# Altium footprint library PcbLibLafe.PcbLib: 297 footprints (part 14 of 19)
Each footprint in its own frame and in the unit in brackets; x right, y up, seen from the top. Pads: shape width x height; smd on the part's side, far side on the other; paste and mask are expansions set on the pad; w line width, h text height; cw(c..) or ccw(c..) is an arc to the next point about the centre after c.
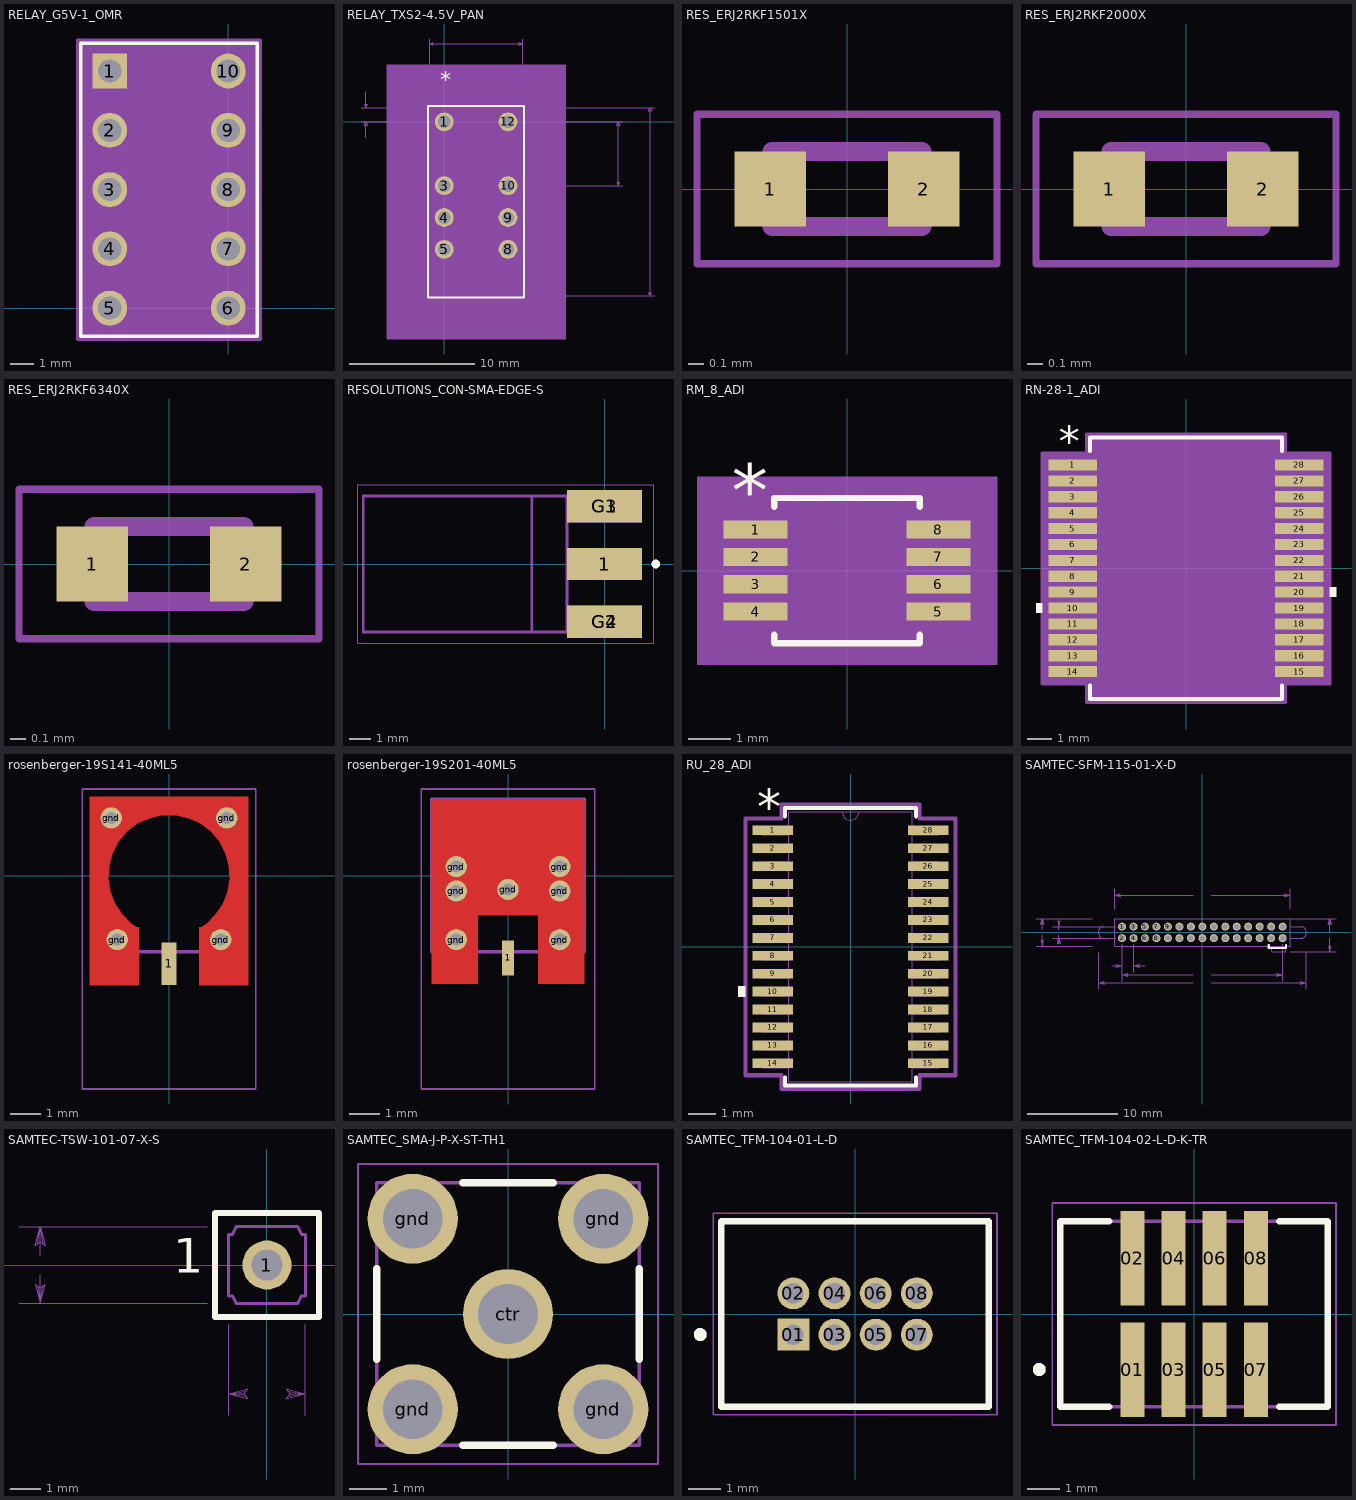
[diagram p13: the footprints below, top view; thin cyan lines are the x and y axes]

## RELAY_G5V-1_OMR [mil]
pads (10):
  rect 59x59 / inner round 59 / far side round 59 hole 39 mask+0: 1(-200,400)
  round 59 hole 39 mask+0: 2(-200,300) 3(-200,200) 4(-200,100) 5(-200,0) 6(0,0) 7(0,100) 8(0,200) 9(0,300) 10(0,400)
Top Overlay:
  lines w6: -248.7,-47.13 -248.7,447.13 48.7,447.13 48.7,-47.13 -248.7,-47.13
Mechanical 13:
  lines w0: -112,442.13 ccw(c-100,442.13) -88,442.13
  lines w1: -243.7,-42.13 -243.7,442.13 43.7,442.13 43.7,-42.13 -243.7,-42.13
Mechanical 15:
  region: 43.7,-42.13 -243.7,-42.13 -243.7,442.13 43.7,442.13
  region: 53.7,-52.13 -253.7,-52.13 -253.7,452.13 53.7,452.13
  lines w6: -253.7,-52.13 53.7,-52.13 53.7,452.13 -253.7,452.13 -253.7,-52.13
3D body "G5V_1.step": height 393.7, standoff -137.8, extent -250,-46.06 45.28,446.06
3D body: height 10, standoff 0, extent 0,0 10,10

## RELAY_TXS2-4.5V_PAN [mil]
pads (8):
  round 59 hole 39 mask+0: 1(0,0) 3(0,-200) 4(0,-300) 5(0,-400) 8(200,-400) 9(200,-300) 10(200,-200) 12(200,0)
Top Overlay:
  lines w6: -50.5,-551 -50.5,50 250.5,50 250.5,-551 -50.5,-551
  text "*" at -12.5,106.67 h50
Mechanical 5:
  region: 380.5,-681 -180.5,-681 -180.5,180 380.5,180
Mechanical 7:
  lines w1: -260.5,0 245.5,0 ; -260.5,45 100,45 660.5,45 ; -245.5,-50 -245.5,0 ; -245.5,95 -245.5,45 ; -45.5,-250.5 -45.5,260 ; 0,-250.5 0,160 ; 100,0 560.5,0 ; 200,-250.5 200,160 ; 245.5,-546 660.5,-546 ; 245.5,-250.5 245.5,260 ; 245.5,-200 560.5,-200 ; -245.5,0 -240.5,-10 -250.5,-10 -245.5,0 ; -245.5,45 -240.5,55 -250.5,55 -245.5,45 ; -45.5,245 -35.5,240 -35.5,250 -45.5,245 ; -45.5,245 245.5,245 ; 0,145 10,140 10,150 0,145 ; 0,145 200,145 ; 200,145 190,140 190,150 200,145 ; 245.5,245 235.5,240 235.5,250 245.5,245 ; 545.5,-200 550.5,-190 540.5,-190 545.5,-200 ; 545.5,-200 545.5,0 ; 545.5,0 550.5,-10 540.5,-10 545.5,0 ; 645.5,-546 650.5,-536 640.5,-536 645.5,-546 ; 645.5,-546 645.5,45 ; 645.5,45 650.5,35 640.5,35 645.5,45
  text "0.591in/15.011mm" at 665.5,-263 h25
  text "0.2in/5.08mm" at 565.5,-112.5 h25
  text "0.045in/1.143mm" at -453,10 h25
  text "0.2in/5.08mm" at 25,165 h25
  text "0.291in/7.391mm" at 6.25,265 h25
  text "Alt 2 Padstyle: OX90Y60D30P" at -237.5,-866 h50
  text "Alt 1 Padstyle: OX60Y90D30P" at -237.5,-806 h50
  text "Default Padstyle: EX59Y59D39P" at -262.5,-746 h50
Mechanical 13:
  lines w0: 88,45 ccw(c100,45) 112,45
  lines w1: -45.5,-546 -45.5,45 245.5,45 245.5,-546 -45.5,-546
  text "*" at -12.5,16.67 h50
Mechanical 15:
  region: 245.5,-546 -45.5,-546 -45.5,45 245.5,45
  region: 255.5,-556 -55.5,-556 -55.5,55 255.5,55
  lines w6: -55.5,-556 255.5,-556 255.5,55 -55.5,55 -55.5,-556
3D body "RELAY_08_7P4X15_PAN.step": height 323.11, standoff -100, extent -45.5,-545.98 245.52,45
3D body: height 10, standoff 0, extent 0,0 10,10

## RES_ERJ2RKF1501X [mm]
pads (2):
  rect 0.475x0.5 smd: 1(-0.512,0) 2(0.512,0)
Mechanical 13:
  lines w0.127: -0.5,-0.25 -0.5,0.25 0.5,0.25 0.5,-0.25 -0.5,-0.25
Mechanical 15:
  lines w0.05: -1,-0.5 -1,0.5 1,0.5 1,-0.5 -1,-0.5
3D body "step_temp.STEP": height 0.35, standoff 0, extent -0.5,-0.25 0.5,0.25

## RES_ERJ2RKF2000X [mm]
pads (2):
  rect 0.475x0.5 smd: 1(-0.512,0) 2(0.512,0)
Mechanical 13:
  lines w0.127: -0.5,-0.25 -0.5,0.25 0.5,0.25 0.5,-0.25 -0.5,-0.25
Mechanical 15:
  lines w0.05: -1,-0.5 -1,0.5 1,0.5 1,-0.5 -1,-0.5
3D body "step_temp.STEP": height 0.35, standoff 0, extent -0.5,-0.25 0.5,0.25

## RES_ERJ2RKF6340X [mm]
pads (2):
  rect 0.475x0.5 smd: 1(-0.512,0) 2(0.512,0)
Mechanical 13:
  lines w0.127: -0.5,-0.25 -0.5,0.25 0.5,0.25 0.5,-0.25 -0.5,-0.25
Mechanical 15:
  lines w0.05: -1,-0.5 -1,0.5 1,0.5 1,-0.5 -1,-0.5
3D body "step_temp.STEP": height 0.35, standoff 0, extent -0.5,-0.25 0.5,0.25

## RFSOLUTIONS_CON-SMA-EDGE-S [mm]
height 6.35
pads (5):
  rect 3.5x1.5 smd: 1(0,0) G1(0,2.7) G2(0,-2.7)
  rect 3.5x1.5 smd far side: G3(0,2.7) G4(0,-2.7)
Top Overlay:
  circle w0.2: c2.4,0 r0.1
Mechanical 13:
  circle w0.2: c2.4,0 r0.1
  lines w0.127: -3.4,-3.175 -1.75,-3.175 -1.75,3.175 -3.4,3.175 ; -3.4,-3.175 -3.4,3.175 ; -3.4,-3.175 -11.27,-3.175 -11.27,3.175 -3.4,3.175
Top Component Center:
  lines w0.127: -3.4,-3.175 -3.4,3.175 ; -3.4,-3.175 -1.75,-3.175 -1.75,3.175 -3.4,3.175 ; -3.4,-3.175 -11.27,-3.175 -11.27,3.175 -3.4,3.175
Mechanical 15:
  lines w0.05: -11.52,-3.7 2.31,-3.7 2.31,3.7 -11.52,3.7 -11.52,-3.7
Mechanical 16:
  lines w0.05: -11.52,-3.7 2.31,-3.7 2.31,3.7 -11.52,3.7 -11.52,-3.7
3D body "step_temp.STEP": height 3.55, standoff -2.8, extent -11.27,-3.175 2.06,3.175

## RM_8_ADI [mil]
pads (8):
  rect 60x17 smd paste+0 mask+0: 1(-85.5,38.39) 2(-85.5,12.8) 3(-85.5,-12.8) 4(-85.5,-38.39) 5(85.5,-38.39) 6(85.5,-12.8) 7(85.5,12.8) 8(85.5,38.39)
Top Overlay:
  lines w6: -68,-59.99 -68,-68 68,-68 68,-59.99 ; -68,59.99 -68,68 68,68 68,59.99
  text "*" at -108,50.39 h50
Mechanical 5:
  region: 140.5,-88 -140.5,-88 -140.5,88 140.5,88
Mechanical 13:
  lines w0: -12,63 ccw(c0,63) 12,63
  lines w1: -101.5,-45.89 -63,-45.89 -63,-30.89 -101.5,-30.89 -101.5,-45.89 ; -101.5,-20.3 -63,-20.3 -63,-5.3 -101.5,-5.3 -101.5,-20.3 ; -101.5,5.3 -63,5.3 -63,20.3 -101.5,20.3 -101.5,5.3 ; -101.5,30.89 -63,30.89 -63,45.89 -101.5,45.89 -101.5,30.89 ; -63,-63 -63,63 63,63 63,-63 -63,-63 ; 63,-45.89 101.5,-45.89 101.5,-30.89 63,-30.89 63,-45.89 ; 63,-20.3 101.5,-20.3 101.5,-5.3 63,-5.3 63,-20.3 ; 63,5.3 101.5,5.3 101.5,20.3 63,20.3 63,5.3 ; 63,30.89 101.5,30.89 101.5,45.89 63,45.89 63,30.89
  text "*" at -60.5,10 h50
Mechanical 15:
  region: -73,-56.89 -125.5,-56.89 -125.5,56.89 -73,56.89 -73,73 73,73 73,56.89 125.5,56.89 125.5,-56.89 73,-56.89 73,-73 -73,-73
  lines w6: -125.5,-56.89 -73,-56.89 -73,-73 73,-73 73,-56.89 125.5,-56.89 125.5,56.89 73,56.89 73,73 -73,73 -73,56.89 -125.5,56.89 -125.5,-56.89
3D body "RM_8_ADI.step": height 43.11, standoff 0, extent -101.5,-62.99 101.5,62.99

## RN-28-1_ADI [mil]
pads (28):
  rect 78x18 smd paste+0 mask+0: 1(-182.5,166.34) 2(-182.5,140.75) 3(-182.5,115.16) 4(-182.5,89.57) 5(-182.5,63.98) 6(-182.5,38.39) 7(-182.5,12.8) 8(-182.5,-12.8) 9(-182.5,-38.39) 10(-182.5,-63.98) 11(-182.5,-89.57) 12(-182.5,-115.16) 13(-182.5,-140.75) 14(-182.5,-166.34) 15(182.5,-166.34) 16(182.5,-140.75) 17(182.5,-115.16) 18(182.5,-89.57) 19(182.5,-63.98) 20(182.5,-38.39) 21(182.5,-12.8) 22(182.5,12.8) 23(182.5,38.39) 24(182.5,63.98) 25(182.5,89.57) 26(182.5,115.16) 27(182.5,140.75) 28(182.5,166.34)
Top Overlay:
  region: 231.5,-30.89 241.5,-30.89 241.5,-45.89 231.5,-45.89
  region: -231.5,-56.48 -241.5,-56.48 -241.5,-71.48 -231.5,-71.48
  lines w6: -154.5,-188.44 -154.5,-210.5 154.5,-210.5 154.5,-188.44 ; -154.5,188.44 -154.5,210.5 154.5,210.5 154.5,188.44
  text "*" at -205,179.34 h50
Mechanical 13:
  lines w0: -12,205.5 ccw(c0,205.5) 12,205.5
  lines w1: -207.5,-174.34 -149.5,-174.34 -149.5,-158.34 -207.5,-158.34 -207.5,-174.34 ; -207.5,-148.75 -149.5,-148.75 -149.5,-132.75 -207.5,-132.75 -207.5,-148.75 ; -207.5,-123.16 -149.5,-123.16 -149.5,-107.16 -207.5,-107.16 -207.5,-123.16 ; -207.5,-97.57 -149.5,-97.57 -149.5,-81.57 -207.5,-81.57 -207.5,-97.57 ; -207.5,-71.98 -149.5,-71.98 -149.5,-55.98 -207.5,-55.98 -207.5,-71.98 ; -207.5,-46.39 -149.5,-46.39 -149.5,-30.39 -207.5,-30.39 -207.5,-46.39 ; -207.5,-20.8 -149.5,-20.8 -149.5,-4.8 -207.5,-4.8 -207.5,-20.8 ; -207.5,4.8 -149.5,4.8 -149.5,20.8 -207.5,20.8 -207.5,4.8 ; -207.5,30.39 -149.5,30.39 -149.5,46.39 -207.5,46.39 -207.5,30.39 ; -207.5,55.98 -149.5,55.98 -149.5,71.98 -207.5,71.98 -207.5,55.98 ; -207.5,81.57 -149.5,81.57 -149.5,97.57 -207.5,97.57 -207.5,81.57 ; -207.5,107.16 -149.5,107.16 -149.5,123.16 -207.5,123.16 -207.5,107.16 ; -207.5,132.75 -149.5,132.75 -149.5,148.75 -207.5,148.75 -207.5,132.75 ; -207.5,158.34 -149.5,158.34 -149.5,174.34 -207.5,174.34 -207.5,158.34 ; -149.5,-205.5 -149.5,205.5 149.5,205.5 149.5,-205.5 -149.5,-205.5 ; 149.5,-174.34 207.5,-174.34 207.5,-158.34 149.5,-158.34 149.5,-174.34 ; 149.5,-148.75 207.5,-148.75 207.5,-132.75 149.5,-132.75 149.5,-148.75 ; 149.5,-123.16 207.5,-123.16 207.5,-107.16 149.5,-107.16 149.5,-123.16 ; 149.5,-97.57 207.5,-97.57 207.5,-81.57 149.5,-81.57 149.5,-97.57 ; 149.5,-71.98 207.5,-71.98 207.5,-55.98 149.5,-55.98 149.5,-71.98 ; 149.5,-46.39 207.5,-46.39 207.5,-30.39 149.5,-30.39 149.5,-46.39 ; 149.5,-20.8 207.5,-20.8 207.5,-4.8 149.5,-4.8 149.5,-20.8 ; 149.5,4.8 207.5,4.8 207.5,20.8 149.5,20.8 149.5,4.8 ; 149.5,30.39 207.5,30.39 207.5,46.39 149.5,46.39 149.5,30.39 ; 149.5,55.98 207.5,55.98 207.5,71.98 149.5,71.98 149.5,55.98 ; 149.5,81.57 207.5,81.57 207.5,97.57 149.5,97.57 149.5,81.57 ; 149.5,107.16 207.5,107.16 207.5,123.16 149.5,123.16 149.5,107.16 ; 149.5,132.75 207.5,132.75 207.5,148.75 149.5,148.75 149.5,132.75 ; 149.5,158.34 207.5,158.34 207.5,174.34 149.5,174.34 149.5,158.34
  text "*" at -147,152.5 h50
Mechanical 15:
  region: -159.5,-185.34 -231.5,-185.34 -231.5,185.34 -159.5,185.34 -159.5,215.5 159.5,215.5 159.5,185.34 231.5,185.34 231.5,-185.34 159.5,-185.34 159.5,-215.5 -159.5,-215.5
  lines w6: -231.5,-185.34 -159.5,-185.34 -159.5,-215.5 159.5,-215.5 159.5,-185.34 231.5,-185.34 231.5,185.34 159.5,185.34 159.5,215.5 -159.5,215.5 -159.5,185.34 -231.5,185.34 -231.5,-185.34
3D body "RN-28-1_ADI.step": height 104.09, standoff 0, extent -207.52,-205.51 207.52,205.51

## rosenberger-19S141-40ML5 [mm]
height 4.1
pads (5):
  rect 0.5x1.4 smd: 1(0,-2.9)
  round 0.7 hole 0.4 mask+0: gnd(-1.9,1.9) gnd(-1.7,-2.1) gnd(1.7,-2.1) gnd(1.9,1.9)
Top Layer:
  region: -2.6,-3.6 -2.6,2.6 2.6,2.6 2.6,-3.6 1,-3.6 1,-1.696 1.06,-1.696 1.236,-1.572 1.543,-1.272 1.779,-0.913 1.933,-0.512 1.998,-0.087 1.971,0.342 1.852,0.755 1.648,1.133 1.368,1.459 1.025,1.717 0.635,1.897 0.215,1.988 -0.215,1.988 -0.635,1.897 -1.025,1.717 -1.368,1.459 -1.648,1.133 -1.852,0.755 -1.971,0.342 -1.998,-0.087 -1.933,-0.512 -1.779,-0.913 -1.543,-1.272 -1.236,-1.572 -1.06,-1.696 -1,-1.696 -1,-3.6
Top Paste:
  region: -2.589,-2.5 -2.589,2.552 2.611,2.552 2.611,-2.5 1.011,-2.5 1.011,-1.744 1.071,-1.744 1.247,-1.62 1.555,-1.32 1.791,-0.961 1.945,-0.56 2.009,-0.135 1.982,0.293 1.864,0.707 1.66,1.085 1.38,1.411 1.036,1.669 0.646,1.848 0.226,1.94 -0.203,1.94 -0.623,1.848 -1.014,1.669 -1.357,1.411 -1.637,1.085 -1.841,0.707 -1.959,0.293 -1.987,-0.135 -1.922,-0.56 -1.768,-0.961 -1.532,-1.32 -1.225,-1.62 -1.049,-1.744 -0.989,-1.744 -0.989,-2.5
Top Solder:
  region: -2.589,-2.5 -2.589,2.552 2.611,2.552 2.611,-2.5 1.011,-2.5 1.011,-1.744 1.071,-1.744 1.247,-1.62 1.555,-1.32 1.791,-0.961 1.945,-0.56 2.009,-0.135 1.982,0.293 1.864,0.707 1.66,1.085 1.38,1.411 1.036,1.669 0.646,1.848 0.226,1.94 -0.203,1.94 -0.623,1.848 -1.014,1.669 -1.357,1.411 -1.637,1.085 -1.841,0.707 -1.959,0.293 -1.987,-0.135 -1.922,-0.56 -1.768,-0.961 -1.532,-1.32 -1.225,-1.62 -1.049,-1.744 -0.989,-1.744 -0.989,-2.5
Mechanical 13:
  lines w0.127: -2.5,-2.5 -2.5,2.5 2.5,2.5 2.5,-2.5 -2.5,-2.5
Mechanical 15:
  lines w0.05: -2.85,-7.01 -1.425,-7.01 1.425,-7.01 2.85,-7.01 2.85,2.85 -2.85,2.85 -2.85,-7.01
3D body "19S141-40ML5-mymodel.STEP": height 4.1, standoff 0, extent -2.5,-3.6 2.5,2.4

## rosenberger-19S201-40ML5 [mm]
height 4.1
pads (8):
  rect 0.4x1.15 smd: 1(0,-2.7)
  round 0.7 hole 0.4 mask+0: gnd(-1.7,-2.1) gnd(-1.7,-0.5) gnd(-1.7,0.3) gnd(0,-0.45) gnd(1.7,-2.1) gnd(1.7,-0.5) gnd(1.7,0.3)
Top Layer:
  region: 1,-1.3 1,-3.55 2.5,-3.55 2.5,2.5 -2.5,2.5 -2.5,-3.55 -1,-3.55 -1,-1.3
Top Paste:
  region: -2.075,1.4 -2.075,2 2.075,2 2.075,1.4
  region: -1.25,1.4 -1.25,0 1.25,0 1.25,1.4
  region: -2.075,-0.9 -2.075,-1.6 -1.075,-1.6 -1.075,-1.3 1.075,-1.3 1.075,-1.6 2.075,-1.6 2.075,-0.9
Top Solder:
  region: -1.25,0 1.25,0 1.25,1.4 2.075,1.4 2.075,2 -2.075,2 -2.075,1.4 -1.25,1.4
  region: -1.075,-1.3 -1.075,-1.6 -2.075,-1.6 -2.075,-0.9 2.075,-0.9 2.075,-1.6 1.075,-1.6 1.075,-1.3
Mechanical 13:
  lines w0.127: -2.5,-2.5 -2.5,2.5 2.5,2.5 2.5,-2.5 -2.5,-2.5
Mechanical 15:
  lines w0.05: -2.85,-7.01 -1.425,-7.01 1.425,-7.01 2.85,-7.01 2.85,2.85 -2.85,2.85 -2.85,-7.01
3D body "rosenberger-19S201-40ML5-smp-right-angle.STEP": height 5, standoff 0, extent -2.5,-2.75 2.5,2.5

## RU_28_ADI [mil]
pads (28):
  rect 58x14 smd paste+0 mask+0: 1(-111,166.34) 2(-111,140.75) 3(-111,115.16) 4(-111,89.57) 5(-111,63.98) 6(-111,38.39) 7(-111,12.8) 8(-111,-12.8) 9(-111,-38.39) 10(-111,-63.98) 11(-111,-89.57) 12(-111,-115.16) 13(-111,-140.75) 14(-111,-166.34) 15(111,-166.34) 16(111,-140.75) 17(111,-115.16) 18(111,-89.57) 19(111,-63.98) 20(111,-38.39) 21(111,-12.8) 22(111,12.8) 23(111,38.39) 24(111,63.98) 25(111,89.57) 26(111,115.16) 27(111,140.75) 28(111,166.34)
Top Overlay:
  region: -150,-56.48 -160,-56.48 -160,-71.48 -150,-71.48
  lines w6: -93.5,-186.44 -93.5,-198 93.5,-198 93.5,-186.44 ; -93.5,186.44 -93.5,198 93.5,198 93.5,186.44
  text "*" at -133.5,175.34 h50
Mechanical 13:
  lines w0: -12,193 ccw(c0,193) 12,193
  lines w1: -126,-172.34 -126,-160.34 -88.5,-160.34 -88.5,-172.34 -126,-172.34 ; -126,-146.75 -126,-134.75 -88.5,-134.75 -88.5,-146.75 -126,-146.75 ; -126,-121.16 -126,-109.16 -88.5,-109.16 -88.5,-121.16 -126,-121.16 ; -126,-95.57 -126,-83.57 -88.5,-83.57 -88.5,-95.57 -126,-95.57 ; -126,-69.98 -126,-57.98 -88.5,-57.98 -88.5,-69.98 -126,-69.98 ; -126,-44.39 -126,-32.39 -88.5,-32.39 -88.5,-44.39 -126,-44.39 ; -126,-18.8 -126,-6.8 -88.5,-6.8 -88.5,-18.8 -126,-18.8 ; -126,6.8 -126,18.8 -88.5,18.8 -88.5,6.8 -126,6.8 ; -126,32.39 -126,44.39 -88.5,44.39 -88.5,32.39 -126,32.39 ; -126,57.98 -126,69.98 -88.5,69.98 -88.5,57.98 -126,57.98 ; -126,83.57 -126,95.57 -88.5,95.57 -88.5,83.57 -126,83.57 ; -126,109.16 -126,121.16 -88.5,121.16 -88.5,109.16 -126,109.16 ; -126,134.75 -126,146.75 -88.5,146.75 -88.5,134.75 -126,134.75 ; -126,160.34 -126,172.34 -88.5,172.34 -88.5,160.34 -126,160.34 ; -88.5,-193 88.5,-193 88.5,193 -88.5,193 -88.5,-193 ; 88.5,-172.34 88.5,-160.34 126,-160.34 126,-172.34 88.5,-172.34 ; 88.5,-146.75 88.5,-134.75 126,-134.75 126,-146.75 88.5,-146.75 ; 88.5,-121.16 88.5,-109.16 126,-109.16 126,-121.16 88.5,-121.16 ; 88.5,-95.57 88.5,-83.57 126,-83.57 126,-95.57 88.5,-95.57 ; 88.5,-69.98 88.5,-57.98 126,-57.98 126,-69.98 88.5,-69.98 ; 88.5,-44.39 88.5,-32.39 126,-32.39 126,-44.39 88.5,-44.39 ; 88.5,-18.8 88.5,-6.8 126,-6.8 126,-18.8 88.5,-18.8 ; 88.5,6.8 88.5,18.8 126,18.8 126,6.8 88.5,6.8 ; 88.5,32.39 88.5,44.39 126,44.39 126,32.39 88.5,32.39 ; 88.5,57.98 88.5,69.98 126,69.98 126,57.98 88.5,57.98 ; 88.5,83.57 88.5,95.57 126,95.57 126,83.57 88.5,83.57 ; 88.5,109.16 88.5,121.16 126,121.16 126,109.16 88.5,109.16 ; 88.5,134.75 88.5,146.75 126,146.75 126,134.75 88.5,134.75 ; 88.5,160.34 88.5,172.34 126,172.34 126,160.34 88.5,160.34
  text "*" at -86,140 h50
Mechanical 15:
  lines w6: -150,-183.34 -150,183.34 -98.5,183.34 -98.5,203 98.5,203 98.5,183.34 150,183.34 150,-183.34 98.5,-183.34 98.5,-203 -98.5,-203 -98.5,-183.34 -150,-183.34
3D body: height 10, standoff 0, extent 0,0 10,10
3D body "RU_28_ADI.step": height 47.09, standoff 0, extent -125.98,-192.99 125.98,192.99

## SAMTEC-SFM-115-01-X-D [mil]
pads (30):
  round 35 hole 25: 1(-350,25) 2(-350,-25) 3(-300,25) 4(-300,-25) 5(-250,25) 6(-250,-25) 7(-200,25) 8(-200,-25) 9(-150,25) 10(-150,-25) 11(-100,25) 12(-100,-25) 13(-50,25) 14(-50,-25) 15(0,25) 16(0,-25) 17(50,25) 18(50,-25) 19(100,25) 20(100,-25) 21(150,25) 22(150,-25) 23(200,25) 24(200,-25) 25(250,25) 26(250,-25) 27(300,25) 28(300,-25) 29(350,25) 30(350,-25)
Top Overlay:
  lines w10: 290,-56 290,-68 365,-68 365,-56
Mechanical 16:
  drawing of 166 lines, arcs and shapes, not listed
Mechanical 40:
  drawing of 154 lines, arcs and shapes, not listed
  text "1.270" at -650.98,-5 h15.5
  text "3.048" at -723.5,-5 h15.5
  text "1.270" at -453.5,-150 h15.5
  text "17.780" at -31.5,-190 h15.5
  text "22.987" at -31.5,-225 h15.5
  text "19.431" at -31.5,157.48 h15.5
  text "3.683" at 529.02,-17.48 h15.5
3D body "SFM-115-01-L-D.stp": height 180, standoff -120, extent -452.5,-90 452.5,55

## SAMTEC-TSW-101-07-X-S [mm]
pads (1):
  round 1.62 hole 1.02: 1(0,0)
Top Overlay:
  lines w0.2: -1.72,-1.72 -1.72,1.72 1.72,1.72 1.72,-1.72 -1.72,-1.72
  text "1" at -3.09,-0.635 h1.97
Top Solder:
  circle w0: c0,0 r0.861
Bottom Solder:
  circle w0: c0,0 r0.861
Mechanical 16:
  lines w0.1: -1.27,-1.016 -1.14,-1.016 -1.016,-1.27 1.016,-1.27 1.14,-1.016 1.27,-1.016 1.27,1.016 1.14,1.016 1.016,1.27 -1.016,1.27 -1.14,1.016 -1.27,1.016 -1.27,-1.016 ; -0.318,-0.318 -0.318,0.318 0.318,0.318 0.318,-0.318 -0.318,-0.318
  text "1" at -3.09,-0.635 h1.97
Mechanical 40:
  lines w0: -8.194,-1.27 -1.971,-1.27 ; -8.194,1.27 -1.971,1.27 ; -7.493,-0.318 -7.493,-1.27 ; -7.493,0.318 -7.493,1.27 ; -1.27,-4.956 -1.27,-1.971 ; -0.851,-4.254 -1.27,-4.254 ; 0.851,-4.254 1.27,-4.254 ; 1.27,-4.956 1.27,-1.971 ; -7.652,-0.635 -7.493,-1.27 ; -7.652,-0.635 -7.493,-0.762 ; -7.652,-0.635 -7.572,-0.698 -7.493,-1.27 ; -7.493,-1.27 -7.334,-0.635 -7.493,-0.762 ; -7.493,-1.27 -7.414,-0.698 -7.493,-0.762 ; -7.493,-1.27 -7.493,-0.762 ; -7.493,0.762 -7.652,0.635 -7.493,1.27 ; -7.493,0.762 -7.334,0.635 ; -7.493,0.762 -7.572,0.698 -7.493,1.27 ; -7.493,0.762 -7.493,1.27 ; -7.493,1.27 -7.334,0.635 ; -7.493,1.27 -7.414,0.698 -7.334,0.635 ; -1.27,-4.254 -0.635,-4.096 ; -1.27,-4.254 -0.635,-4.413 -0.762,-4.254 ; -1.27,-4.254 -0.698,-4.334 -0.762,-4.254 ; -1.27,-4.254 -0.762,-4.254 ; -1.27,-4.254 -0.698,-4.175 -0.635,-4.096 ; -0.762,-4.254 -0.635,-4.096 ; 0.635,-4.413 1.27,-4.254 ; 0.635,-4.413 0.762,-4.254 ; 0.635,-4.413 0.698,-4.334 1.27,-4.254 ; 0.762,-4.254 0.635,-4.096 1.27,-4.254 ; 0.762,-4.254 0.698,-4.175 1.27,-4.254 ; 0.762,-4.254 1.27,-4.254
  text "2.540" at -8.153,-0.127 h0.39
  text "2.540" at -0.66,-4.382 h0.39
Mechanical 42:
  lines w0.1: -1.72,-1.72 -1.72,1.72 1.72,1.72 1.72,-1.72 -1.72,-1.72

## SAMTEC_SMA-J-P-X-ST-TH1 [mm]
pads (5):
  round 2.4 hole 1.6: ctr(0,0) gnd(-2.54,-2.54) gnd(-2.54,2.54) gnd(2.54,-2.54) gnd(2.54,2.54)
Top Overlay:
  lines w0.2: -3.5,-1.2 -3.5,1.2 ; -1.2,-3.5 1.2,-3.5 ; -1.2,3.5 1.2,3.5 ; 3.5,-1.2 3.5,1.2
Mechanical 13:
  lines w0.1: -3.5,-3.5 -3.5,3.5 3.5,3.5 3.5,-3.5 -3.5,-3.5
Mechanical 15:
  lines w0.05: -4,-4 -4,4 4,4 4,-4 -4,-4
3D body "SMA-J-P-H-ST-TH1.stp": height 9.55, standoff -3.95, extent -3.5,-3.5 3.5,3.5

## SAMTEC_TFM-104-01-L-D [mm]
pads (8):
  rect 0.985x0.985 hole 0.635: 01(-1.905,-0.635)
  round 0.985 hole 0.635: 02(-1.905,0.635) 03(-0.635,-0.635) 04(-0.635,0.635) 05(0.635,-0.635) 06(0.635,0.635) 07(1.905,-0.635) 08(1.905,0.635)
Top Overlay:
  circle w0.2: c-4.78,-0.635 r0.1
  lines w0.2: -4.13,-2.86 -4.13,2.86 4.13,2.86 4.13,-2.86 -4.13,-2.86
Mechanical 13:
  circle w0.2: c-4.78,-0.635 r0.1
  lines w0.1: -4.13,-2.86 -4.13,2.86 ; -4.13,-2.86 4.13,-2.86 ; -4.13,-2.86 -4.13,2.86 ; -4.13,2.86 4.13,2.86 ; -4.13,2.86 4.13,2.86 ; 4.13,-2.86 4.13,2.86 ; 4.13,-2.86 4.13,2.86
Mechanical 15:
  lines w0.05: -4.38,-3.11 -4.38,3.11 4.38,3.11 4.38,-3.11 -4.38,-3.11

## SAMTEC_TFM-104-02-L-D-K-TR [mm]
pads (8):
  rect 0.74x2.92 smd: 01(-1.905,-1.715) 02(-1.905,1.715) 03(-0.635,-1.715) 04(-0.635,1.715) 05(0.635,-1.715) 06(0.635,1.715) 07(1.905,-1.715) 08(1.905,1.715)
Top Overlay:
  circle w0.2: c-4.78,-1.715 r0.1
  lines w0.2: -2.625,-2.86 -4.13,-2.86 -4.13,2.86 -2.625,2.86 ; 2.625,-2.86 4.13,-2.86 4.13,2.86 2.625,2.86
Mechanical 13:
  circle w0.2: c-4.78,-1.715 r0.1
  lines w0.1: -4.13,-2.86 -4.13,2.86 ; -4.13,-2.86 4.13,-2.86 ; -4.13,-2.86 -4.13,2.86 ; -4.13,2.86 4.13,2.86 ; -4.13,2.86 4.13,2.86 ; 4.13,-2.86 4.13,2.86 ; 4.13,-2.86 4.13,2.86
Mechanical 15:
  lines w0.05: -4.38,-3.425 -4.38,3.425 4.38,3.425 4.38,-3.425 -4.38,-3.425
3D body "TFM-104-02-L-D-K-TR.stp": height 5.87, standoff 0, extent -4.155,-2.984 4.1,2.984